# Altium footprint library ConnectMedical.PcbLib: 76 footprints (part 3 of 5)
Each footprint in its own frame and in the unit in brackets; x right, y up, seen from the top. Pads: shape width x height; smd on the part's side, far side on the other; paste and mask are expansions set on the pad; w line width, h text height; cw(c..) or ccw(c..) is an arc to the next point about the centre after c.
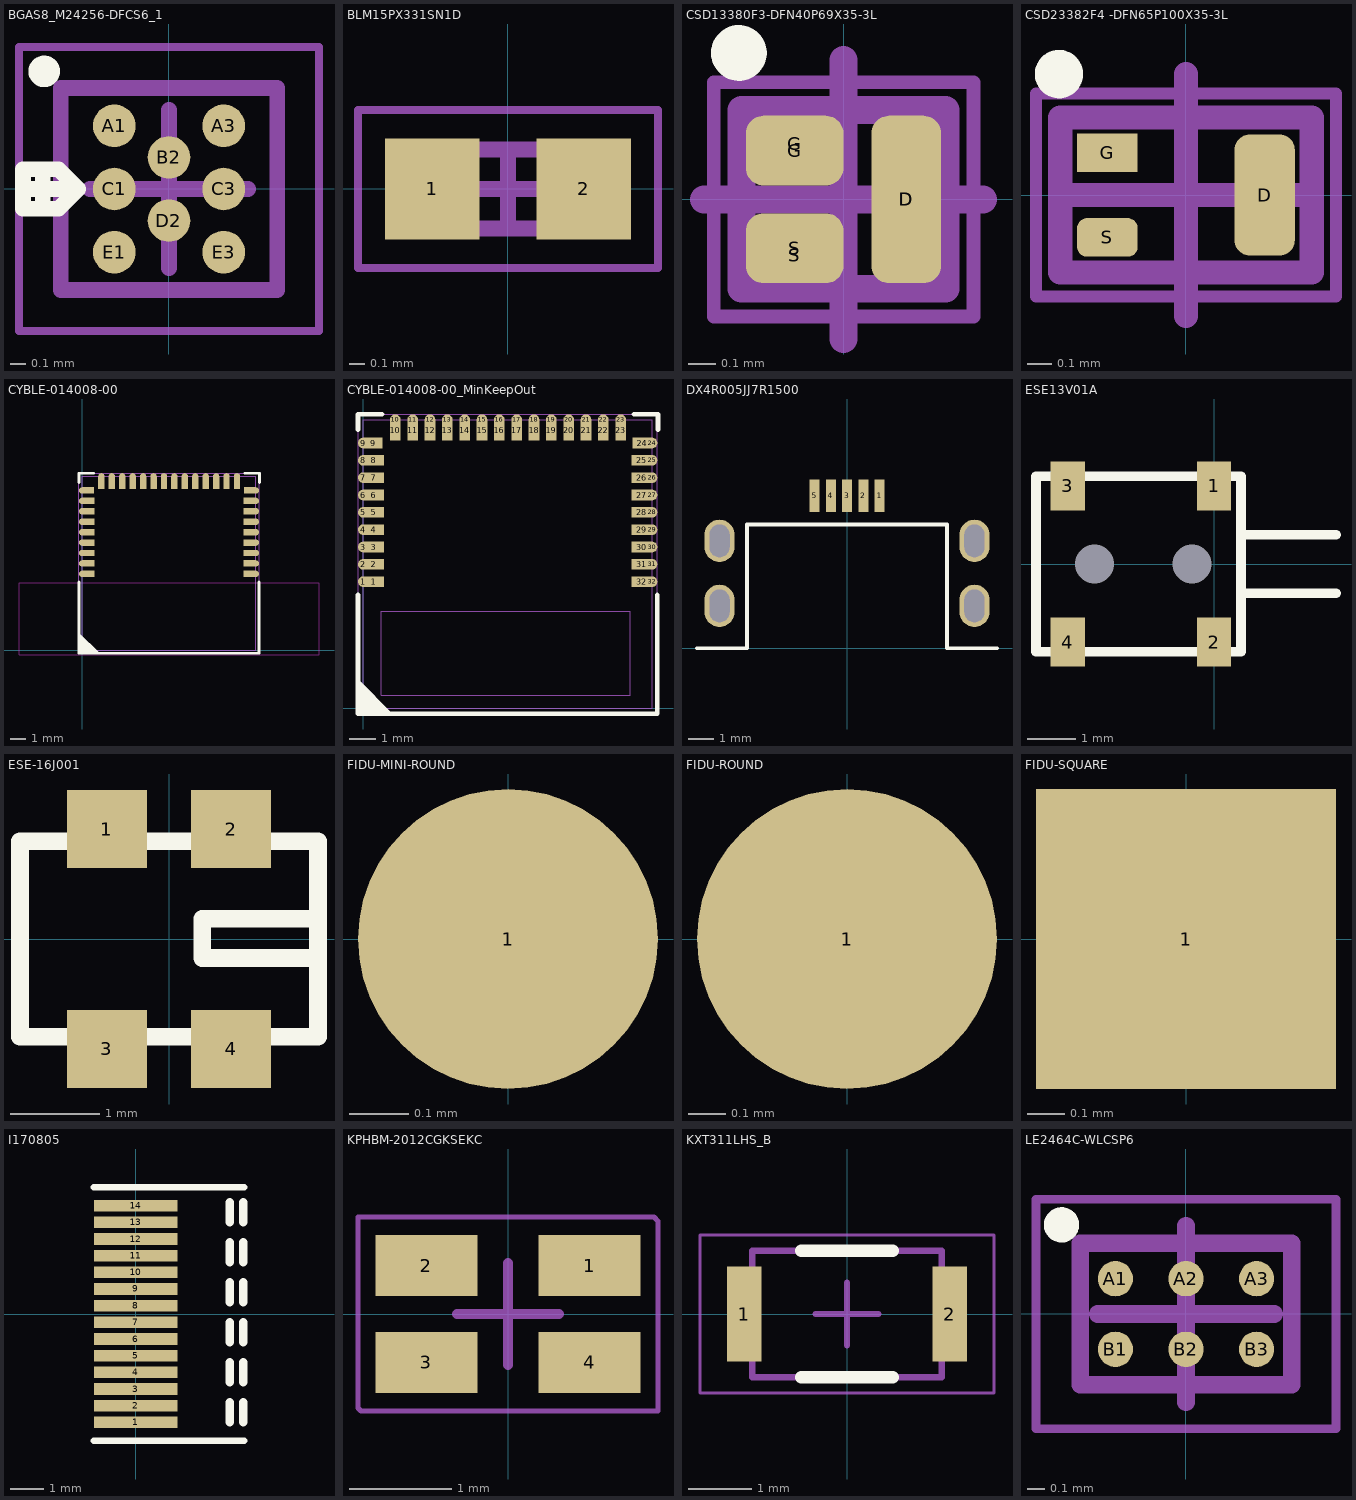
[diagram p2: the footprints below, top view; thin cyan lines are the x and y axes]

## BGAS8_M24256-DFCS6_1 [mm] "BGA, 8-Leads, Body 1.37x1.28mmx0.58mm, Pitch 0.40mm"
height 0.58
pads (8):
  round 0.27 smd mask-0.01: A1(-0.346,0.4) A3(0.346,0.4) B2(0,0.2) C1(-0.346,0) C3(0.346,0) D2(0,-0.2) E1(-0.346,-0.4) E3(0.346,-0.4)
Top Overlay:
  circle w0.1: c-0.79,0.745 r0.05
  lines w0.1: -0.9,0 -0.6,0 ; -0.8,-0.075 -0.8,0.125 ; -0.925,-0.125 -0.7,-0.125 -0.575,0 -0.7,0.125 -0.925,0.125 -0.925,-0.125
Mechanical 15:
  lines w0.05: -0.95,-0.9 -0.95,0.9 0.95,0.9 0.95,-0.9 -0.95,-0.9
  lines w0.1: -0.5,0 0.5,0 ; 0,-0.5 0,0.5 ; -0.685,-0.64 -0.685,0.64 0.685,0.64 0.685,-0.64 -0.685,-0.64
3D body "M24256-DFCS6TPK v2 v1.step": height 0.55, standoff 0.14, extent -0.679,-0.636 0.679,0.635

## BLM15PX331SN1D [mm] "FERRITE BEAD 330 OHM 0402 1LN"
height 0.5
pads (2):
  rect 0.6x0.64 smd: 1(-0.48,0) 2(0.48,0)
Mechanical 13:
  lines w0.1: -0.5,-0.25 -0.5,0.25 0.5,0.25 0.5,-0.25 -0.5,-0.25
Mechanical 15:
  lines w0.05: -0.95,-0.5 -0.95,0.5 0.95,0.5 0.95,-0.5 -0.95,-0.5
  lines w0.1: -0.25,0 0.25,0 ; 0,-0.25 0,0.25
3D body "BLM15PX331SN1D.step": height 0.5, standoff 0, extent -0.5,-0.25 0.5,0.25

## CSD13380F3-DFN40P69X35-3L [mm] "DFN, 3-Leads, Body 0.60x0.69mm, Pitch 0.40mm, IPC High Density"
height 0.35
pads (6):
  rrect50% 0.25x0.6 smd paste-1 mask-0.05: D(0.225,0)
  rrect50% 0.15x0.5 on Top Paste: D(0.225,0)
  rrect50% 0.35x0.25 smd paste-1 mask-0.05: G(-0.175,0.175) S(-0.175,-0.175)
  rrect50% 0.25x0.2 on Top Paste: G(-0.175,0.2) S(-0.175,-0.2)
Top Overlay:
  circle w0.1: c-0.375,0.525 r0.05
Mechanical 13:
  lines w0.1: -0.365,-0.32 0.365,-0.32 0.365,0.32 -0.365,0.32 -0.365,-0.32
Mechanical 15:
  lines w0.05: -0.465,-0.42 0.465,-0.42 0.465,0.42 -0.465,0.42 -0.465,-0.42
  lines w0.1: -0.5,0 0.5,0 ; 0,-0.5 0,0.5
3D body "CSD13380F3-DFN40P69X35-3L v2-PIN1.step": height 0.35, standoff 0, extent -0.365,-0.32 0.365,0.32

## CSD23382F4 -DFN65P100X35-3L [mm] "DFN, 3-Leads, Body 0.60x1.00mm, Pitch 0.65mm, IPC High Density"
height 0.35
pads (3):
  rrect50% 0.25x0.5 smd paste-0.01 mask+0.04: D(0.325,0)
  rect 0.25x0.16 smd paste-0.02 mask+0.04: G(-0.325,0.175)
  rrect50% 0.25x0.16 smd paste-0.01 mask+0.04: S(-0.325,-0.175)
Top Overlay:
  circle w0.1: c-0.525,0.5 r0.05
Mechanical 13:
  lines w0.1: -0.52,-0.32 0.52,-0.32 0.52,0.32 -0.52,0.32 -0.52,-0.32
Mechanical 15:
  lines w0.05: -0.62,-0.42 0.62,-0.42 0.62,0.42 -0.62,0.42 -0.62,-0.42
  lines w0.1: -0.5,0 0.5,0 ; 0,-0.5 0,0.5
3D body "CSD23382F4 -DFN65P100X35-3L v1-PIN1.step": height 0.35, standoff 0, extent -0.52,-0.32 0.52,0.32

## CYBLE-014008-00 [mil]
pads (64):
  round 16 smd mask+2: 1(0,190) 2(0,216) 3(0,242) 4(0,268) 5(0,294) 6(0,320) 7(0,346) 8(0,372) 9(0,398) 10(48,433) 11(74,433) 12(100,433) 13(126,433) 14(152,433) 15(178,433) 16(204,433) 17(230,433) 18(256,433) 19(282,433) 20(308,433) 21(334,433) 22(360,433) 23(386,433) 24(433,398) 25(433,372) 26(433,346) 27(433,320) 28(433,294) 29(433,268) 30(433,242) 31(433,216) 32(433,190)
  rect 31x16 smd mask+2: 1(15.5,190) 2(15.5,216) 3(15.5,242) 4(15.5,268) 5(15.5,294) 6(15.5,320) 7(15.5,346) 8(15.5,372) 25(417.5,372) 26(417.5,346) 27(417.5,320) 28(417.5,294) 29(417.5,268) 30(417.5,242) 31(417.5,216) 32(417.5,190)
  rect 29x16 smd mask+2: 9(14.5,398) 24(418.5,398)
  rect 16x31 smd mask+2: 10(48,417.5) 11(74,417.5) 12(100,417.5) 13(126,417.5) 14(152,417.5) 15(178,417.5) 16(204,417.5) 17(230,417.5) 18(256,417.5) 19(282,417.5) 20(308,417.5) 21(334,417.5) 22(360,417.5) 23(386,417.5)
Top Overlay:
  region: -8,43.4 -8,-8 43.4,-8
  lines w7: -8,170 -8,-8 441,-8 441,170 ; -8,418 -8,441 28,441 ; 406,441 442,441 442,418
Keep-Out Layer:
  text "Antenna Keep Out Area" at 19,69 h50
Keep-Out Layer:
  lines w1: -157.48,-11.81 590.55,-11.81 590.55,168.31 400.59,168.31 26.57,168.31 -157.48,168.31 -157.48,-11.81
Mechanical 15:
  lines w1: -8,-8 -8,441 441,441 441,-8 -8,-8 ; 0,0 0,433.07 433.07,433.07 433.07,0 0,0
Non-printed:
  text "BLE Module" at -23.62,-11.81 h39.37
  text "CYBLE-014008-00" at 81,257 h39.37
  text "P31" at 372.05,455.71 h39.37
  text "VAN" at 319.88,455.71 h39.37
  text "P22" at 267.72,455.71 h39.37
  text "P30" at 216.54,455.71 h39.37
  text "P26" at 164.37,454.72 h39.37
  text "P12" at 112.2,455.71 h39.37
  text "P05" at 60.04,454.72 h39.37
  text "P37" at 398,455 h39.37
  text "P34" at 346,455 h39.37
  text "P23" at 294,455 h39.37
  text "P21" at 242,455 h39.37
  text "P13" at 190,455 h39.37
  text "VDR" at 138,455 h39.37
  text "P06" at 86,455 h39.37
  text "P15" at -70.87,257.87 h39.37
  text "P07" at -70.87,311.02 h39.37
  text "P14" at -73.82,361.22 h39.37
  text "P10" at -72,231 h39.37
  text "P01" at -71,283 h39.37
  text "VDD" at -84,335 h39.37
  text "P04" at -72,387 h39.37
  text "P11" at -71.85,205.71 h39.37
  text "GND" at -86,178 h39.37
  text "GND" at 455,178.7 h39.37
  text "P35" at 455,386.7 h39.37
  text "VREF" at 455,334.7 h39.37
  text "P36" at 455,282.7 h39.37
  text "P24" at 455,230.7 h39.37
  text "XRES" at 453.74,255.91 h39.37
  text "P32" at 455.71,310.04 h39.37
  text "P33" at 454.72,361.22 h39.37
  text "P25" at 455.71,203.74 h39.37
3D body "CYBLE-014008-00_AP214.STEP": height 71.71, standoff 0.85, extent 1.35,0.01 434.42,433.08

## CYBLE-014008-00_MinKeepOut [mil]
pads (64):
  round 16 smd mask+2: 1(0,190) 2(0,216) 3(0,242) 4(0,268) 5(0,294) 6(0,320) 7(0,346) 8(0,372) 9(0,398) 10(48,433) 11(74,433) 12(100,433) 13(126,433) 14(152,433) 15(178,433) 16(204,433) 17(230,433) 18(256,433) 19(282,433) 20(308,433) 21(334,433) 22(360,433) 23(386,433) 24(433,398) 25(433,372) 26(433,346) 27(433,320) 28(433,294) 29(433,268) 30(433,242) 31(433,216) 32(433,190)
  rect 31x16 smd mask+2: 1(15.5,190) 2(15.5,216) 3(15.5,242) 4(15.5,268) 5(15.5,294) 6(15.5,320) 7(15.5,346) 8(15.5,372) 25(417.5,372) 26(417.5,346) 27(417.5,320) 28(417.5,294) 29(417.5,268) 30(417.5,242) 31(417.5,216) 32(417.5,190)
  rect 29x16 smd mask+2: 9(14.5,398) 24(418.5,398)
  rect 16x31 smd mask+2: 10(48,417.5) 11(74,417.5) 12(100,417.5) 13(126,417.5) 14(152,417.5) 15(178,417.5) 16(204,417.5) 17(230,417.5) 18(256,417.5) 19(282,417.5) 20(308,417.5) 21(334,417.5) 22(360,417.5) 23(386,417.5)
Top Overlay:
  region: -8,43.4 -8,-8 43.4,-8
  lines w7: -8,170 -8,-8 441,-8 441,170 ; -8,418 -8,441 28,441 ; 406,441 442,441 442,418
Mechanical 15:
  lines w1: -8,-8 -8,441 441,441 441,-8 -8,-8 ; 0,0 0,433.07 433.07,433.07 433.07,0 0,0 ; 26.57,19.68 400.59,19.68 400.59,145.67 26.57,145.67 26.57,19.68
Non-printed:
  text "BLE Module" at -23.62,-11.81 h39.37
  text "CYBLE-014008-00" at 81,257 h39.37
  text "P31" at 372.05,455.71 h39.37
  text "VAN" at 319.88,455.71 h39.37
  text "P22" at 267.72,455.71 h39.37
  text "P30" at 216.54,455.71 h39.37
  text "P26" at 164.37,454.72 h39.37
  text "P12" at 112.2,455.71 h39.37
  text "P05" at 60.04,454.72 h39.37
  text "P37" at 398,455 h39.37
  text "P34" at 346,455 h39.37
  text "P23" at 294,455 h39.37
  text "P21" at 242,455 h39.37
  text "P13" at 190,455 h39.37
  text "VDR" at 138,455 h39.37
  text "P06" at 86,455 h39.37
  text "P15" at -70.87,257.87 h39.37
  text "P07" at -70.87,311.02 h39.37
  text "P14" at -73.82,361.22 h39.37
  text "P10" at -72,231 h39.37
  text "P01" at -71,283 h39.37
  text "VDD" at -84,335 h39.37
  text "P04" at -72,387 h39.37
  text "P11" at -71.85,205.71 h39.37
  text "GND" at -86,178 h39.37
  text "GND" at 455,178.7 h39.37
  text "P35" at 455,386.7 h39.37
  text "VREF" at 455,334.7 h39.37
  text "P36" at 455,282.7 h39.37
  text "P24" at 455,230.7 h39.37
  text "XRES" at 453.74,255.91 h39.37
  text "P32" at 455.71,310.04 h39.37
  text "P33" at 454.72,361.22 h39.37
  text "P25" at 455.71,203.74 h39.37
3D body "CYBLE-014008-00_AP214.STEP": height 71.71, standoff 0.85, extent 1.35,0.01 434.42,433.08

## DX4R005JJ7R1500 [mm] "USB Connector"
pads (10):
  rect 0.4x1.3 smd: 1(1.3,6.1) 2(0.65,6.1) 3(0,6.1) 4(-0.65,6.1) 5(-1.3,6.1)
  oval 1.2x1.7 hole 1.3 slot 0.8 at 0 deg: ""(-5.1,1.7) ""(-5.1,4.3) ""(-5.1,4.3) ""(5.1,1.7) ""(5.1,4.3)
Top Overlay:
  lines w0.15: -6,0 -4,0 -4,4.95 4,4.95 4,0 6,0

## ESE13V01A [mm]
pads (6):
  rect 0.7x1 smd: 1(0,1.6) 2(0,-1.6) 3(-3,1.6) 4(-3,-1.6)
  rect 0x0 hole 0.8 unplated: 5(-0.45,0) 6(-2.45,0)
Top Overlay:
  lines w0.2: -3.65,-1.8 0.55,-1.8 0.55,1.8 -3.65,1.8 -3.65,-1.753 ; 0.55,-0.6 2.5,-0.6 ; 0.55,0.6 2.5,0.6

## ESE-16J001 [mm] "SWITCH DETECTOR SPST-NO 10MA 5V"
pads (4):
  rect 0.9x0.875 smd mask+0.09: 1(-0.7,1.238) 2(0.7,1.238) 3(-0.7,-1.238) 4(0.7,-1.238)
Top Overlay:
  lines w0.2: 1.672,0.228 0.378,0.228 0.375,0.225 0.375,-0.214 1.675,-0.214 ; -1.675,-1.1 -1.675,1.1 1.675,1.1 1.675,-1.1 -1.675,-1.1
3D body "ESE16J001.step": height 2.47, standoff -0.01, extent -1.675,-1.274 1.675,1.274

## FIDU-MINI-ROUND [mil]
pads (1):
  round 20 smd paste-78.74 mask+7.99: 1(0,0)

## FIDU-ROUND [mm]
pads (1):
  round 0.8 smd paste-2 mask+0.43: 1(0,0)

## FIDU-SQUARE [mm]
pads (1):
  rect 0.8x0.8 smd paste-2 mask+0.43: 1(0,0)

## I170805 [mm] "OLED Display using I2C"
pads (14):
  rect 2.5x0.35 smd: 1(0,-3.25) 2(0,-2.75) 3(0,-2.25) 4(0,-1.75) 5(0,-1.25) 6(0,-0.75) 7(0,-0.25) 8(0,0.25) 9(0,0.75) 10(0,1.25) 11(0,1.75) 12(0,2.25) 13(0,2.75) 14(0,3.25)
Top Overlay:
  lines w0.2: -1.25,-3.8 3.25,-3.8 ; -1.25,3.8 3.25,3.8
  lines w0.254: 2.825,-3.25 2.825,-2.65 ; 2.825,-2.05 2.825,-1.45 ; 2.825,-0.85 2.825,-0.25 ; 2.825,0.35 2.825,0.95 ; 2.825,1.55 2.825,2.15 ; 2.825,2.75 2.825,3.35 ; 3.225,-3.25 3.225,-2.65 ; 3.225,-2.05 3.225,-1.45 ; 3.225,-0.85 3.225,-0.25 ; 3.225,0.35 3.225,0.95 ; 3.225,1.55 3.225,2.15 ; 3.225,2.75 3.225,3.35

## KPHBM-2012CGKSEKC [mm] "LED, Green, Orange, SMD"
pads (4):
  rect 1x0.6 smd: 1(0.8,0.475) 2(-0.8,0.475) 3(-0.8,-0.475) 4(0.8,-0.475)
Mechanical 15:
  lines w0.05: -1.47,-0.92 -1.47,0.95 1.43,0.95 1.47,0.91 1.47,-0.95 -1.44,-0.95 -1.47,-0.92
  lines w0.1: -0.5,0 0.5,0 ; 0,-0.5 0,0.5
3D body "KPHBM-2012CGKSEKC v2.step": height 0.43, standoff 0, extent -1,-0.625 1,0.625

## KXT311LHS_B [mm] "SWITCH TACTILE SPST-NO 0.05A 12V"
height 0.6
pads (2):
  rect 0.55x1.5 smd mask+0.08: 1(-1.625,0) 2(1.625,0)
Top Overlay:
  lines w0.2: -0.725,-1 0.725,-1 ; -0.725,1 0.725,1
Mechanical 13:
  lines w0.1: -1.5,-1 1.5,-1 1.5,1 -1.5,1 -1.5,-1
Mechanical 15:
  lines w0.05: -2.325,-1.25 2.325,-1.25 2.325,1.25 -2.325,1.25 -2.325,-1.25
  lines w0.1: -0.5,0 0.5,0 ; 0,-0.5 0,0.5
3D body "0180-004-DM-0073-switch.STEP": height 0.5, standoff 0, extent -1.75,-1 1.75,1

## LE2464C-WLCSP6 [mm] "BGA, 6-Leads, Body 1.20x0.80mmx0.33mm, Pitch 0.40mm"
height 0.33
pads (6):
  round 0.2 smd paste-0.05 mask+0.05: A1(-0.4,0.2) A2(0,0.2) A3(0.4,0.2) B1(-0.4,-0.2) B2(0,-0.2) B3(0.4,-0.2)
Top Overlay:
  circle w0.1: c-0.705,0.505 r0.05
Mechanical 13:
  lines w0.1: -0.6,-0.4 0.6,-0.4 0.6,0.4 -0.6,0.4 -0.6,-0.4
Mechanical 15:
  lines w0.05: -0.85,-0.65 0.85,-0.65 0.85,0.65 -0.85,0.65 -0.85,-0.65
  lines w0.1: -0.5,0 0.5,0 ; 0,-0.5 0,0.5
3D body "LE2464C-WLCSP6.step": height 0.33, standoff 0, extent -0.6,-0.4 0.6,0.4